# Altium footprint library ref-packages.PCBLIB: 1544 footprints (part 14 of 103)
Each footprint in its own frame and in the unit in brackets; x right, y up, seen from the top. Pads: shape width x height; smd on the part's side, far side on the other; paste and mask are expansions set on the pad; w line width, h text height; cw(c..) or ccw(c..) is an arc to the next point about the centre after c.
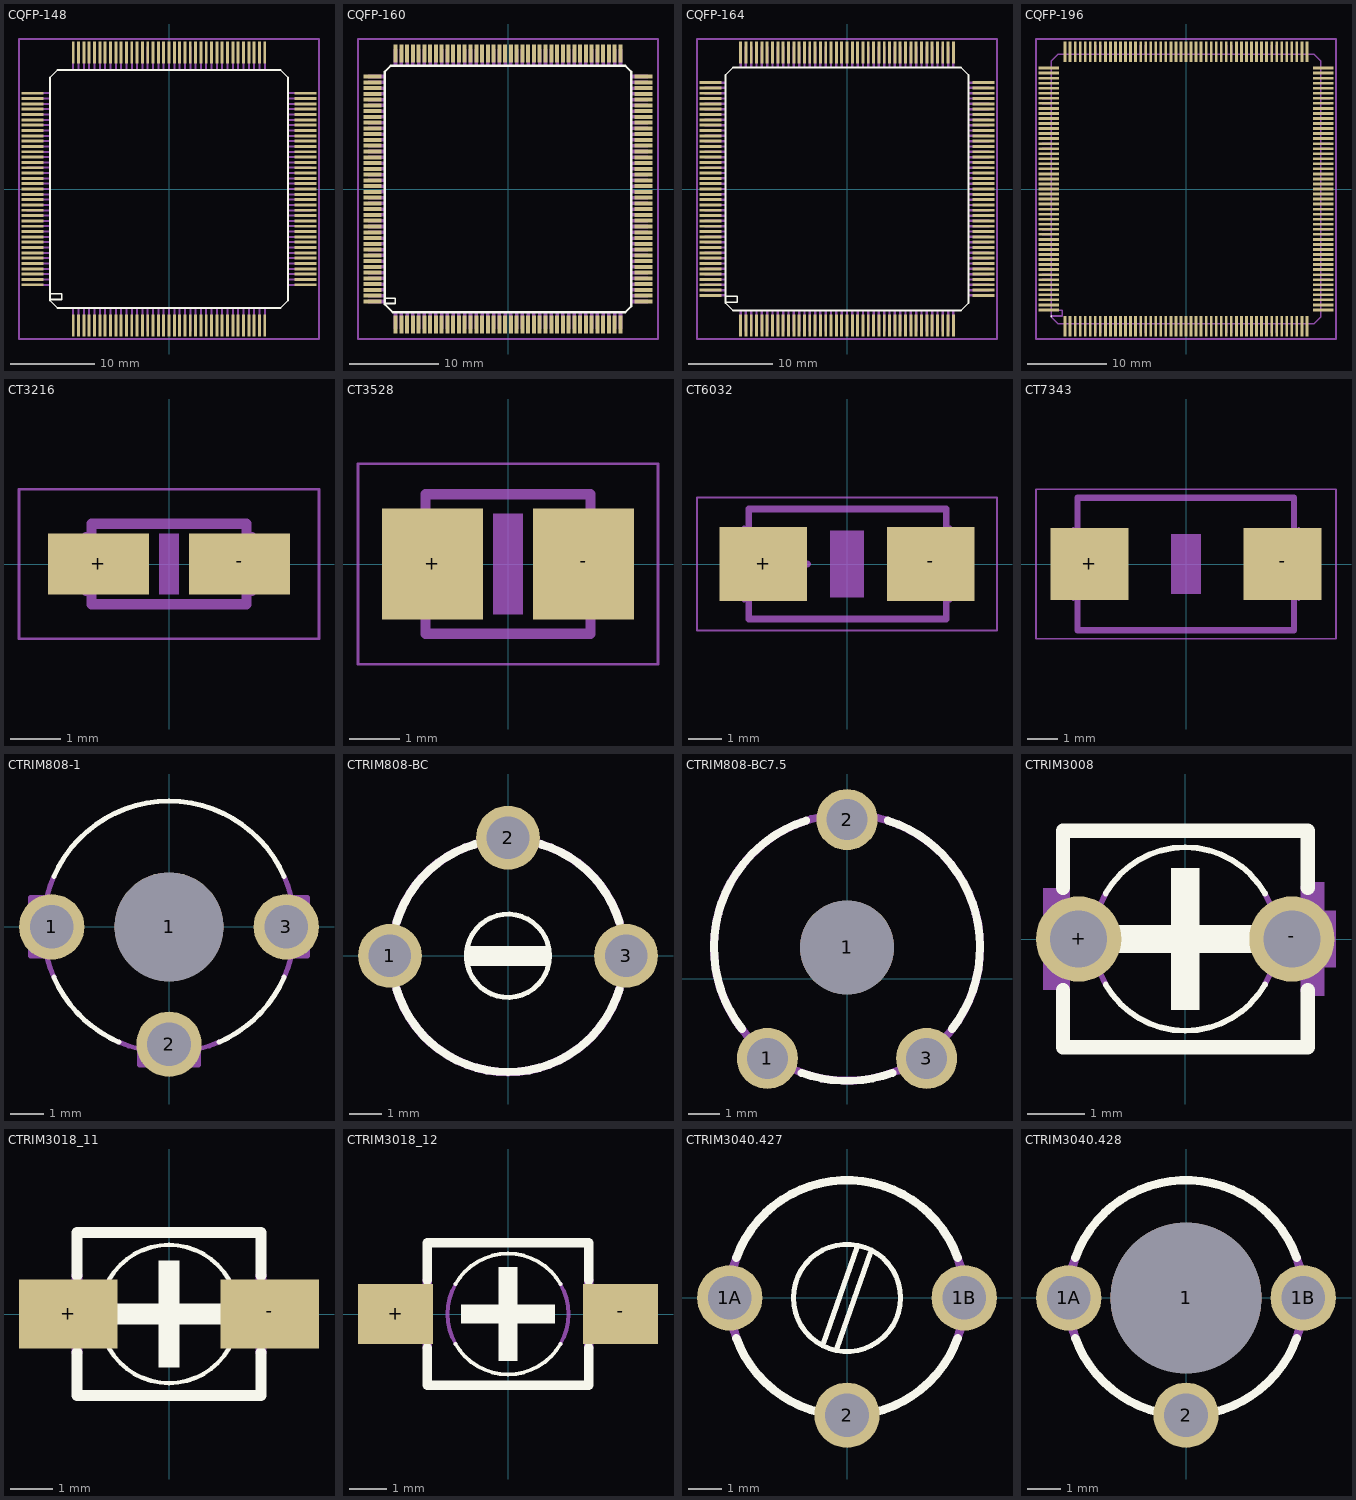
[diagram p13: the footprints below, top view; thin cyan lines are the x and y axes]

## CQFP-148 [mm]
pads (148):
  rect 0.35x2.6 smd: 1(-11.43,-16.3) 2(-10.795,-16.3) 3(-10.16,-16.3) 4(-9.525,-16.3) 5(-8.89,-16.3) 6(-8.255,-16.3) 7(-7.62,-16.3) 8(-6.985,-16.3) 9(-6.35,-16.3) 10(-5.715,-16.3) 11(-5.08,-16.3) 12(-4.445,-16.3) 13(-3.81,-16.3) 14(-3.175,-16.3) 15(-2.54,-16.3) 16(-1.905,-16.3) 17(-1.27,-16.3) 18(-0.635,-16.3) 19(0,-16.3) 20(0.635,-16.3) 21(1.27,-16.3) 22(1.905,-16.3) 23(2.54,-16.3) 24(3.175,-16.3) 25(3.81,-16.3) 26(4.445,-16.3) 27(5.08,-16.3) 28(5.715,-16.3) 29(6.35,-16.3) 30(6.985,-16.3) 31(7.62,-16.3) 32(8.255,-16.3) 33(8.89,-16.3) 34(9.525,-16.3) 35(10.16,-16.3) 36(10.795,-16.3) 37(11.43,-16.3) 75(11.43,16.3) 76(10.795,16.3) 77(10.16,16.3) 78(9.525,16.3) 79(8.89,16.3) 80(8.255,16.3) 81(7.62,16.3) 82(6.985,16.3) 83(6.35,16.3) 84(5.715,16.3) 85(5.08,16.3) 86(4.445,16.3) 87(3.81,16.3) 88(3.175,16.3) 89(2.54,16.3) 90(1.905,16.3) 91(1.27,16.3) 92(0.635,16.3) 93(0,16.3) 94(-0.635,16.3) 95(-1.27,16.3) 96(-1.905,16.3) 97(-2.54,16.3) 98(-3.175,16.3) 99(-3.81,16.3) 100(-4.445,16.3) 101(-5.08,16.3) 102(-5.715,16.3) 103(-6.35,16.3) 104(-6.985,16.3) 105(-7.62,16.3) 106(-8.255,16.3) 107(-8.89,16.3) 108(-9.525,16.3) 109(-10.16,16.3) 110(-10.795,16.3) 111(-11.43,16.3)
  rect 2.6x0.35 smd: 38(16.3,-11.43) 39(16.3,-10.795) 40(16.3,-10.16) 41(16.3,-9.525) 42(16.3,-8.89) 43(16.3,-8.255) 44(16.3,-7.62) 45(16.3,-6.985) 46(16.3,-6.35) 47(16.3,-5.715) 48(16.3,-5.08) 49(16.3,-4.445) 50(16.3,-3.81) 51(16.3,-3.175) 52(16.3,-2.54) 53(16.3,-1.905) 54(16.3,-1.27) 55(16.3,-0.635) 56(16.3,0) 57(16.3,0.635) 58(16.3,1.27) 59(16.3,1.905) 60(16.3,2.54) 61(16.3,3.175) 62(16.3,3.81) 63(16.3,4.445) 64(16.3,5.08) 65(16.3,5.715) 66(16.3,6.35) 67(16.3,6.985) 68(16.3,7.62) 69(16.3,8.255) 70(16.3,8.89) 71(16.3,9.525) 72(16.3,10.16) 73(16.3,10.795) 74(16.3,11.43) 112(-16.3,11.43) 113(-16.3,10.795) 114(-16.3,10.16) 115(-16.3,9.525) 116(-16.3,8.89) 117(-16.3,8.255) 118(-16.3,7.62) 119(-16.3,6.985) 120(-16.3,6.35) 121(-16.3,5.715) 122(-16.3,5.08) 123(-16.3,4.445) 124(-16.3,3.81) 125(-16.3,3.175) 126(-16.3,2.54) 127(-16.3,1.905) 128(-16.3,1.27) 129(-16.3,0.635) 130(-16.3,0) 131(-16.3,-0.635) 132(-16.3,-1.27) 133(-16.3,-1.905) 134(-16.3,-2.54) 135(-16.3,-3.175) 136(-16.3,-3.81) 137(-16.3,-4.445) 138(-16.3,-5.08) 139(-16.3,-5.715) 140(-16.3,-6.35) 141(-16.3,-6.985) 142(-16.3,-7.62) 143(-16.3,-8.255) 144(-16.3,-8.89) 145(-16.3,-9.525) 146(-16.3,-10.16) 147(-16.3,-10.795) 148(-16.3,-11.43)
Top Overlay:
  lines w0.203: -14.1,-12.5 -12.8,-12.5 -12.8,-13.2 -14.2,-13.2 ; -14.2,-13.2 -14.2,13.3 -13.3,14.2 13.3,14.2 14.2,13.3 14.2,-13.3 13.3,-14.2 -13.3,-14.2 -14.2,-13.3 -14.2,-13.2
Mechanical 16:
  rectangle: -11.55,-17 -11.31,-14.25
  rectangle: -10.915,-17 -10.675,-14.25
  rectangle: -10.28,-17 -10.04,-14.25
  rectangle: -9.645,-17 -9.405,-14.25
  rectangle: -9.01,-17 -8.77,-14.25
  rectangle: -8.375,-17 -8.135,-14.25
  rectangle: -7.74,-17 -7.5,-14.25
  rectangle: -7.105,-17 -6.865,-14.25
  rectangle: -6.47,-17 -6.23,-14.25
  rectangle: -5.835,-17 -5.595,-14.25
  rectangle: -5.2,-17 -4.96,-14.25
  rectangle: -4.565,-17 -4.325,-14.25
  rectangle: -3.93,-17 -3.69,-14.25
  rectangle: -3.295,-17 -3.055,-14.25
  rectangle: -2.66,-17 -2.42,-14.25
  rectangle: -2.025,-17 -1.785,-14.25
  rectangle: -1.39,-17 -1.15,-14.25
  rectangle: -0.755,-17 -0.515,-14.25
  rectangle: -0.12,-17 0.12,-14.25
  rectangle: 0.515,-17 0.755,-14.25
  rectangle: 1.15,-17 1.39,-14.25
  rectangle: 1.785,-17 2.025,-14.25
  rectangle: 2.42,-17 2.66,-14.25
  rectangle: 3.055,-17 3.295,-14.25
  rectangle: 3.69,-17 3.93,-14.25
  rectangle: 4.325,-17 4.565,-14.25
  rectangle: 4.96,-17 5.2,-14.25
  rectangle: 5.595,-17 5.835,-14.25
  rectangle: 6.23,-17 6.47,-14.25
  rectangle: 6.865,-17 7.105,-14.25
  rectangle: 7.5,-17 7.74,-14.25
  rectangle: 8.135,-17 8.375,-14.25
  rectangle: 8.77,-17 9.01,-14.25
  rectangle: 9.405,-17 9.645,-14.25
  rectangle: 10.04,-17 10.28,-14.25
  rectangle: 10.675,-17 10.915,-14.25
  rectangle: 11.31,-17 11.55,-14.25
  rectangle: 14.25,-11.55 17,-11.31
  rectangle: 14.25,-10.915 17,-10.675
  rectangle: 14.25,-10.28 17,-10.04
  rectangle: 14.25,-9.645 17,-9.405
  rectangle: 14.25,-9.01 17,-8.77
  rectangle: 14.25,-8.375 17,-8.135
  rectangle: 14.25,-7.74 17,-7.5
  rectangle: 14.25,-7.105 17,-6.865
  rectangle: 14.25,-6.47 17,-6.23
  rectangle: 14.25,-5.835 17,-5.595
  rectangle: 14.25,-5.2 17,-4.96
  rectangle: 14.25,-4.565 17,-4.325
  rectangle: 14.25,-3.93 17,-3.69
  rectangle: 14.25,-3.295 17,-3.055
  rectangle: 14.25,-2.66 17,-2.42
  rectangle: 14.25,-2.025 17,-1.785
  rectangle: 14.25,-1.39 17,-1.15
  rectangle: 14.25,-0.755 17,-0.515
  rectangle: 14.25,-0.12 17,0.12
  rectangle: 14.25,0.515 17,0.755
  rectangle: 14.25,1.15 17,1.39
  rectangle: 14.25,1.785 17,2.025
  rectangle: 14.25,2.42 17,2.66
  rectangle: 14.25,3.055 17,3.295
  rectangle: 14.25,3.69 17,3.93
  rectangle: 14.25,4.325 17,4.565
  rectangle: 14.25,4.96 17,5.2
  rectangle: 14.25,5.595 17,5.835
  rectangle: 14.25,6.23 17,6.47
  rectangle: 14.25,6.865 17,7.105
  rectangle: 14.25,7.5 17,7.74
  rectangle: 14.25,8.135 17,8.375
  rectangle: 14.25,8.77 17,9.01
  rectangle: 14.25,9.405 17,9.645
  rectangle: 14.25,10.04 17,10.28
  rectangle: 14.25,10.675 17,10.915
  rectangle: 14.25,11.31 17,11.55
  rectangle: 11.31,14.25 11.55,17
  rectangle: 10.675,14.25 10.915,17
  rectangle: 10.04,14.25 10.28,17
  rectangle: 9.405,14.25 9.645,17
  rectangle: 8.77,14.25 9.01,17
  rectangle: 8.135,14.25 8.375,17
  rectangle: 7.5,14.25 7.74,17
  rectangle: 6.865,14.25 7.105,17
  rectangle: 6.23,14.25 6.47,17
  rectangle: 5.595,14.25 5.835,17
  rectangle: 4.96,14.25 5.2,17
  rectangle: 4.325,14.25 4.565,17
  rectangle: 3.69,14.25 3.93,17
  rectangle: 3.055,14.25 3.295,17
  rectangle: 2.42,14.25 2.66,17
  rectangle: 1.785,14.25 2.025,17
  rectangle: 1.15,14.25 1.39,17
  rectangle: 0.515,14.25 0.755,17
  rectangle: -0.12,14.25 0.12,17
  rectangle: -0.755,14.25 -0.515,17
  rectangle: -1.39,14.25 -1.15,17
  rectangle: -2.025,14.25 -1.785,17
  rectangle: -2.66,14.25 -2.42,17
  rectangle: -3.295,14.25 -3.055,17
  rectangle: -3.93,14.25 -3.69,17
  rectangle: -4.565,14.25 -4.325,17
  rectangle: -5.2,14.25 -4.96,17
  rectangle: -5.835,14.25 -5.595,17
  rectangle: -6.47,14.25 -6.23,17
  rectangle: -7.105,14.25 -6.865,17
  rectangle: -7.74,14.25 -7.5,17
  rectangle: -8.375,14.25 -8.135,17
  rectangle: -9.01,14.25 -8.77,17
  rectangle: -9.645,14.25 -9.405,17
  rectangle: -10.28,14.25 -10.04,17
  rectangle: -10.915,14.25 -10.675,17
  rectangle: -11.55,14.25 -11.31,17
  rectangle: -17,11.31 -14.25,11.55
  rectangle: -17,10.675 -14.25,10.915
  rectangle: -17,10.04 -14.25,10.28
  rectangle: -17,9.405 -14.25,9.645
  rectangle: -17,8.77 -14.25,9.01
  rectangle: -17,8.135 -14.25,8.375
  rectangle: -17,7.5 -14.25,7.74
  rectangle: -17,6.865 -14.25,7.105
  rectangle: -17,6.23 -14.25,6.47
  rectangle: -17,5.595 -14.25,5.835
  rectangle: -17,4.96 -14.25,5.2
  rectangle: -17,4.325 -14.25,4.565
  rectangle: -17,3.69 -14.25,3.93
  rectangle: -17,3.055 -14.25,3.295
  rectangle: -17,2.42 -14.25,2.66
  rectangle: -17,1.785 -14.25,2.025
  rectangle: -17,1.15 -14.25,1.39
  rectangle: -17,0.515 -14.25,0.755
  rectangle: -17,-0.12 -14.25,0.12
  rectangle: -17,-0.755 -14.25,-0.515
  rectangle: -17,-1.39 -14.25,-1.15
  rectangle: -17,-2.025 -14.25,-1.785
  rectangle: -17,-2.66 -14.25,-2.42
  rectangle: -17,-3.295 -14.25,-3.055
  rectangle: -17,-3.93 -14.25,-3.69
  rectangle: -17,-4.565 -14.25,-4.325
  rectangle: -17,-5.2 -14.25,-4.96
  rectangle: -17,-5.835 -14.25,-5.595
  rectangle: -17,-6.47 -14.25,-6.23
  rectangle: -17,-7.105 -14.25,-6.865
  rectangle: -17,-7.74 -14.25,-7.5
  rectangle: -17,-8.375 -14.25,-8.135
  rectangle: -17,-9.01 -14.25,-8.77
  rectangle: -17,-9.645 -14.25,-9.405
  rectangle: -17,-10.28 -14.25,-10.04
  rectangle: -17,-10.915 -14.25,-10.675
  rectangle: -17,-11.55 -14.25,-11.31
Mechanical 27:
  lines w0.2: -17.903,-17.903 17.903,-17.903 17.903,17.903 -17.903,17.903 -17.903,-17.903

## CQFP-160 [mm]
pads (160):
  rect 0.45x2 smd: 1(-12.675,-15.275) 2(-12.025,-15.275) 3(-11.375,-15.275) 4(-10.725,-15.275) 5(-10.075,-15.275) 6(-9.425,-15.275) 7(-8.775,-15.275) 8(-8.125,-15.275) 9(-7.475,-15.275) 10(-6.825,-15.275) 11(-6.175,-15.275) 12(-5.525,-15.275) 13(-4.875,-15.275) 14(-4.225,-15.275) 15(-3.575,-15.275) 16(-2.925,-15.275) 17(-2.275,-15.275) 18(-1.625,-15.275) 19(-0.975,-15.275) 20(-0.325,-15.275) 21(0.325,-15.275) 22(0.975,-15.275) 23(1.625,-15.275) 24(2.275,-15.275) 25(2.925,-15.275) 26(3.575,-15.275) 27(4.225,-15.275) 28(4.875,-15.275) 29(5.525,-15.275) 30(6.175,-15.275) 31(6.825,-15.275) 32(7.475,-15.275) 33(8.125,-15.275) 34(8.775,-15.275) 35(9.425,-15.275) 36(10.075,-15.275) 37(10.725,-15.275) 38(11.375,-15.275) 39(12.025,-15.275) 40(12.675,-15.275) 81(12.675,15.275) 82(12.025,15.275) 83(11.375,15.275) 84(10.725,15.275) 85(10.075,15.275) 86(9.425,15.275) 87(8.775,15.275) 88(8.125,15.275) 89(7.475,15.275) 90(6.825,15.275) 91(6.175,15.275) 92(5.525,15.275) 93(4.875,15.275) 94(4.225,15.275) 95(3.575,15.275) 96(2.925,15.275) 97(2.275,15.275) 98(1.625,15.275) 99(0.975,15.275) 100(0.325,15.275) 101(-0.325,15.275) 102(-0.975,15.275) 103(-1.625,15.275) 104(-2.275,15.275) 105(-2.925,15.275) 106(-3.575,15.275) 107(-4.225,15.275) 108(-4.875,15.275) 109(-5.525,15.275) 110(-6.175,15.275) 111(-6.825,15.275) 112(-7.475,15.275) 113(-8.125,15.275) 114(-8.775,15.275) 115(-9.425,15.275) 116(-10.075,15.275) 117(-10.725,15.275) 118(-11.375,15.275) 119(-12.025,15.275) 120(-12.675,15.275)
  rect 2x0.45 smd: 41(15.275,-12.675) 42(15.275,-12.025) 43(15.275,-11.375) 44(15.275,-10.725) 45(15.275,-10.075) 46(15.275,-9.425) 47(15.275,-8.775) 48(15.275,-8.125) 49(15.275,-7.475) 50(15.275,-6.825) 51(15.275,-6.175) 52(15.275,-5.525) 53(15.275,-4.875) 54(15.275,-4.225) 55(15.275,-3.575) 56(15.275,-2.925) 57(15.275,-2.275) 58(15.275,-1.625) 59(15.275,-0.975) 60(15.275,-0.325) 61(15.275,0.325) 62(15.275,0.975) 63(15.275,1.625) 64(15.275,2.275) 65(15.275,2.925) 66(15.275,3.575) 67(15.275,4.225) 68(15.275,4.875) 69(15.275,5.525) 70(15.275,6.175) 71(15.275,6.825) 72(15.275,7.475) 73(15.275,8.125) 74(15.275,8.775) 75(15.275,9.425) 76(15.275,10.075) 77(15.275,10.725) 78(15.275,11.375) 79(15.275,12.025) 80(15.275,12.675) 121(-15.275,12.675) 122(-15.275,12.025) 123(-15.275,11.375) 124(-15.275,10.725) 125(-15.275,10.075) 126(-15.275,9.425) 127(-15.275,8.775) 128(-15.275,8.125) 129(-15.275,7.475) 130(-15.275,6.825) 131(-15.275,6.175) 132(-15.275,5.525) 133(-15.275,4.875) 134(-15.275,4.225) 135(-15.275,3.575) 136(-15.275,2.925) 137(-15.275,2.275) 138(-15.275,1.625) 139(-15.275,0.975) 140(-15.275,0.325) 141(-15.275,-0.325) 142(-15.275,-0.975) 143(-15.275,-1.625) 144(-15.275,-2.275) 145(-15.275,-2.925) 146(-15.275,-3.575) 147(-15.275,-4.225) 148(-15.275,-4.875) 149(-15.275,-5.525) 150(-15.275,-6.175) 151(-15.275,-6.825) 152(-15.275,-7.475) 153(-15.275,-8.125) 154(-15.275,-8.775) 155(-15.275,-9.425) 156(-15.275,-10.075) 157(-15.275,-10.725) 158(-15.275,-11.375) 159(-15.275,-12.025) 160(-15.275,-12.675)
Top Overlay:
  lines w0.203: -13.8,-12.9 -12.7,-12.9 -12.7,-12.3 -13.8,-12.3
  lines w0.254: -13.9,-13 -13,-13.9 13.2,-13.9 13.9,-13.2 13.9,13.2 13.2,13.9 -13.2,13.9 -13.9,13.2 -13.9,-13
Mechanical 16:
  drawing of 160 lines, arcs and shapes, not listed
Mechanical 27:
  lines w0.2: -16.903,-16.903 16.903,-16.903 16.903,16.903 -16.903,16.903 -16.903,-16.903

## CQFP-164 [mm]
pads (164):
  rect 0.35x2.6 smd: 1(-12.7,-16.3) 2(-12.065,-16.3) 3(-11.43,-16.3) 4(-10.795,-16.3) 5(-10.16,-16.3) 6(-9.525,-16.3) 7(-8.89,-16.3) 8(-8.255,-16.3) 9(-7.62,-16.3) 10(-6.985,-16.3) 11(-6.35,-16.3) 12(-5.715,-16.3) 13(-5.08,-16.3) 14(-4.445,-16.3) 15(-3.81,-16.3) 16(-3.175,-16.3) 17(-2.54,-16.3) 18(-1.905,-16.3) 19(-1.27,-16.3) 20(-0.635,-16.3) 21(0,-16.3) 22(0.635,-16.3) 23(1.27,-16.3) 24(1.905,-16.3) 25(2.54,-16.3) 26(3.175,-16.3) 27(3.81,-16.3) 28(4.445,-16.3) 29(5.08,-16.3) 30(5.715,-16.3) 31(6.35,-16.3) 32(6.985,-16.3) 33(7.62,-16.3) 34(8.255,-16.3) 35(8.89,-16.3) 36(9.525,-16.3) 37(10.16,-16.3) 38(10.795,-16.3) 39(11.43,-16.3) 40(12.065,-16.3) 41(12.7,-16.3) 83(12.7,16.3) 84(12.065,16.3) 85(11.43,16.3) 86(10.795,16.3) 87(10.16,16.3) 88(9.525,16.3) 89(8.89,16.3) 90(8.255,16.3) 91(7.62,16.3) 92(6.985,16.3) 93(6.35,16.3) 94(5.715,16.3) 95(5.08,16.3) 96(4.445,16.3) 97(3.81,16.3) 98(3.175,16.3) 99(2.54,16.3) 100(1.905,16.3) 101(1.27,16.3) 102(0.635,16.3) 103(0,16.3) 104(-0.635,16.3) 105(-1.27,16.3) 106(-1.905,16.3) 107(-2.54,16.3) 108(-3.175,16.3) 109(-3.81,16.3) 110(-4.445,16.3) 111(-5.08,16.3) 112(-5.715,16.3) 113(-6.35,16.3) 114(-6.985,16.3) 115(-7.62,16.3) 116(-8.255,16.3) 117(-8.89,16.3) 118(-9.525,16.3) 119(-10.16,16.3) 120(-10.795,16.3) 121(-11.43,16.3) 122(-12.065,16.3) 123(-12.7,16.3)
  rect 2.6x0.35 smd: 42(16.3,-12.7) 43(16.3,-12.065) 44(16.3,-11.43) 45(16.3,-10.795) 46(16.3,-10.16) 47(16.3,-9.525) 48(16.3,-8.89) 49(16.3,-8.255) 50(16.3,-7.62) 51(16.3,-6.985) 52(16.3,-6.35) 53(16.3,-5.715) 54(16.3,-5.08) 55(16.3,-4.445) 56(16.3,-3.81) 57(16.3,-3.175) 58(16.3,-2.54) 59(16.3,-1.905) 60(16.3,-1.27) 61(16.3,-0.635) 62(16.3,0) 63(16.3,0.635) 64(16.3,1.27) 65(16.3,1.905) 66(16.3,2.54) 67(16.3,3.175) 68(16.3,3.81) 69(16.3,4.445) 70(16.3,5.08) 71(16.3,5.715) 72(16.3,6.35) 73(16.3,6.985) 74(16.3,7.62) 75(16.3,8.255) 76(16.3,8.89) 77(16.3,9.525) 78(16.3,10.16) 79(16.3,10.795) 80(16.3,11.43) 81(16.3,12.065) 82(16.3,12.7) 124(-16.3,12.7) 125(-16.3,12.065) 126(-16.3,11.43) 127(-16.3,10.795) 128(-16.3,10.16) 129(-16.3,9.525) 130(-16.3,8.89) 131(-16.3,8.255) 132(-16.3,7.62) 133(-16.3,6.985) 134(-16.3,6.35) 135(-16.3,5.715) 136(-16.3,5.08) 137(-16.3,4.445) 138(-16.3,3.81) 139(-16.3,3.175) 140(-16.3,2.54) 141(-16.3,1.905) 142(-16.3,1.27) 143(-16.3,0.635) 144(-16.3,0) 145(-16.3,-0.635) 146(-16.3,-1.27) 147(-16.3,-1.905) 148(-16.3,-2.54) 149(-16.3,-3.175) 150(-16.3,-3.81) 151(-16.3,-4.445) 152(-16.3,-5.08) 153(-16.3,-5.715) 154(-16.3,-6.35) 155(-16.3,-6.985) 156(-16.3,-7.62) 157(-16.3,-8.255) 158(-16.3,-8.89) 159(-16.3,-9.525) 160(-16.3,-10.16) 161(-16.3,-10.795) 162(-16.3,-11.43) 163(-16.3,-12.065) 164(-16.3,-12.7)
Top Overlay:
  lines w0.203: -14.4,-12.8 -13.1,-12.8 -13.1,-13.5 -14.5,-13.5 ; -14.5,-13.5 -14.5,13.6 -13.6,14.5 13.6,14.5 14.5,13.6 14.5,-13.6 13.6,-14.5 -13.6,-14.5 -14.5,-13.6 -14.5,-13.5
Mechanical 16:
  drawing of 164 lines, arcs and shapes, not listed
Mechanical 27:
  lines w0.2: -17.903,-17.903 17.903,-17.903 17.903,17.903 -17.903,17.903 -17.903,-17.903

## CQFP-196 [mm]
pads (196):
  rect 0.35x2.6 smd: 1(-15.24,-17.3) 2(-14.605,-17.3) 3(-13.97,-17.3) 4(-13.335,-17.3) 5(-12.7,-17.3) 6(-12.065,-17.3) 7(-11.43,-17.3) 8(-10.795,-17.3) 9(-10.16,-17.3) 10(-9.525,-17.3) 11(-8.89,-17.3) 12(-8.255,-17.3) 13(-7.62,-17.3) 14(-6.985,-17.3) 15(-6.35,-17.3) 16(-5.715,-17.3) 17(-5.08,-17.3) 18(-4.445,-17.3) 19(-3.81,-17.3) 20(-3.175,-17.3) 21(-2.54,-17.3) 22(-1.905,-17.3) 23(-1.27,-17.3) 24(-0.635,-17.3) 25(0,-17.3) 26(0.635,-17.3) 27(1.27,-17.3) 28(1.905,-17.3) 29(2.54,-17.3) 30(3.175,-17.3) 31(3.81,-17.3) 32(4.445,-17.3) 33(5.08,-17.3) 34(5.715,-17.3) 35(6.35,-17.3) 36(6.985,-17.3) 37(7.62,-17.3) 38(8.255,-17.3) 39(8.89,-17.3) 40(9.525,-17.3) 41(10.16,-17.3) 42(10.795,-17.3) 43(11.43,-17.3) 44(12.065,-17.3) 45(12.7,-17.3) 46(13.335,-17.3) 47(13.97,-17.3) 48(14.605,-17.3) 49(15.24,-17.3) 99(15.24,17.3) 100(14.605,17.3) 101(13.97,17.3) 102(13.335,17.3) 103(12.7,17.3) 104(12.065,17.3) 105(11.43,17.3) 106(10.795,17.3) 107(10.16,17.3) 108(9.525,17.3) 109(8.89,17.3) 110(8.255,17.3) 111(7.62,17.3) 112(6.985,17.3) 113(6.35,17.3) 114(5.715,17.3) 115(5.08,17.3) 116(4.445,17.3) 117(3.81,17.3) 118(3.175,17.3) 119(2.54,17.3) 120(1.905,17.3) 121(1.27,17.3) 122(0.635,17.3) 123(0,17.3) 124(-0.635,17.3) 125(-1.27,17.3) 126(-1.905,17.3) 127(-2.54,17.3) 128(-3.175,17.3) 129(-3.81,17.3) 130(-4.445,17.3) 131(-5.08,17.3) 132(-5.715,17.3) 133(-6.35,17.3) 134(-6.985,17.3) 135(-7.62,17.3) 136(-8.255,17.3) 137(-8.89,17.3) 138(-9.525,17.3) 139(-10.16,17.3) 140(-10.795,17.3) 141(-11.43,17.3) 142(-12.065,17.3) 143(-12.7,17.3) 144(-13.335,17.3) 145(-13.97,17.3) 146(-14.605,17.3) 147(-15.24,17.3)
  rect 2.6x0.35 smd: 50(17.3,-15.24) 51(17.3,-14.605) 52(17.3,-13.97) 53(17.3,-13.335) 54(17.3,-12.7) 55(17.3,-12.065) 56(17.3,-11.43) 57(17.3,-10.795) 58(17.3,-10.16) 59(17.3,-9.525) 60(17.3,-8.89) 61(17.3,-8.255) 62(17.3,-7.62) 63(17.3,-6.985) 64(17.3,-6.35) 65(17.3,-5.715) 66(17.3,-5.08) 67(17.3,-4.445) 68(17.3,-3.81) 69(17.3,-3.175) 70(17.3,-2.54) 71(17.3,-1.905) 72(17.3,-1.27) 73(17.3,-0.635) 74(17.3,0) 75(17.3,0.635) 76(17.3,1.27) 77(17.3,1.905) 78(17.3,2.54) 79(17.3,3.175) 80(17.3,3.81) 81(17.3,4.445) 82(17.3,5.08) 83(17.3,5.715) 84(17.3,6.35) 85(17.3,6.985) 86(17.3,7.62) 87(17.3,8.255) 88(17.3,8.89) 89(17.3,9.525) 90(17.3,10.16) 91(17.3,10.795) 92(17.3,11.43) 93(17.3,12.065) 94(17.3,12.7) 95(17.3,13.335) 96(17.3,13.97) 97(17.3,14.605) 98(17.3,15.24) 148(-17.3,15.24) 149(-17.3,14.605) 150(-17.3,13.97) 151(-17.3,13.335) 152(-17.3,12.7) 153(-17.3,12.065) 154(-17.3,11.43) 155(-17.3,10.795) 156(-17.3,10.16) 157(-17.3,9.525) 158(-17.3,8.89) 159(-17.3,8.255) 160(-17.3,7.62) 161(-17.3,6.985) 162(-17.3,6.35) 163(-17.3,5.715) 164(-17.3,5.08) 165(-17.3,4.445) 166(-17.3,3.81) 167(-17.3,3.175) 168(-17.3,2.54) 169(-17.3,1.905) 170(-17.3,1.27) 171(-17.3,0.635) 172(-17.3,0) 173(-17.3,-0.635) 174(-17.3,-1.27) 175(-17.3,-1.905) 176(-17.3,-2.54) 177(-17.3,-3.175) 178(-17.3,-3.81) 179(-17.3,-4.445) 180(-17.3,-5.08) 181(-17.3,-5.715) 182(-17.3,-6.35) 183(-17.3,-6.985) 184(-17.3,-7.62) 185(-17.3,-8.255) 186(-17.3,-8.89) 187(-17.3,-9.525) 188(-17.3,-10.16) 189(-17.3,-10.795) 190(-17.3,-11.43) 191(-17.3,-12.065) 192(-17.3,-12.7) 193(-17.3,-13.335) 194(-17.3,-13.97) 195(-17.3,-14.605) 196(-17.3,-15.24)
Top Overlay:
  lines w0.203: -17,-16.1 -17,-16
Mechanical 16:
  drawing of 207 lines, arcs and shapes, not listed
Mechanical 27:
  lines w0.2: -18.903,-18.903 18.903,-18.903 18.903,18.903 -18.903,18.903 -18.903,-18.903

## CT3216 [mm]
pads (2):
  rect 2x1.2 smd: +(-1.4,0) -(1.4,0)
Mechanical 6:
  rectangle: -0.2,-0.6 0.2,0.6
Mechanical 16:
  lines w0.152: -1.651,-0.559 -1.651,0.559 ; 1.651,-0.559 1.651,0.559
  lines w0.203: -1.26,0 -0.7,0 ; -0.97,-0.3 -0.97,0.26 ; -1.535,-0.798 -1.535,0.798 1.535,0.798 1.535,-0.798 -1.535,-0.798
Mechanical 27:
  lines w0.051: -2.973,-1.483 2.973,-1.483 2.973,1.483 -2.973,1.483 -2.973,-1.483

## CT3528 [mm]
pads (2):
  rect 2x2.2 smd: +(-1.5,0) -(1.5,0)
Mechanical 6:
  rectangle: -0.3,-1 0.3,1
Mechanical 16:
  lines w0.152: -1.778,-1.016 -1.778,1.016 ; 1.778,-1.016 1.778,1.016
  lines w0.203: -1.31,0 -0.68,0 ; -1,-0.33 -1,0.3 ; -1.637,-1.383 -1.637,1.383 1.637,1.383 1.637,-1.383 -1.637,-1.383
Mechanical 27:
  lines w0.051: -2.973,-1.983 2.973,-1.983 2.973,1.983 -2.973,1.983 -2.973,-1.983

## CT6032 [mil]
pads (2):
  rect 102.36x86.61 smd: +(-98.43,0) -(98.43,0)
Mechanical 6:
  rectangle: -19.69,-39.37 19.69,39.37
Mechanical 16:
  lines w6: -120.98,-42.01 -120.98,42.01 ; 120.98,-42.01 120.98,42.01
  lines w8: -96.46,0 -46.46,0 ; -70.87,-25.2 -70.87,24.8 ; -115.43,-64.45 -115.43,64.45 116.42,64.45 116.42,-64.45 -115.43,-64.45
Mechanical 27:
  lines w2: -176.1,-78.07 176.1,-78.07 176.1,78.07 -176.1,78.07 -176.1,-78.07

## CT7343 [mil]
pads (2):
  rect 102.36x94.49 smd: +(-125.98,0) -(125.98,0)
Mechanical 6:
  rectangle: -19.69,-39.37 19.69,39.37
Mechanical 16:
  lines w6: -147.01,-45 -147.01,45 ; 147.01,-45 147.01,45
  lines w8: -121.65,0 -80.32,0 ; -100.39,-20.47 -100.39,20.47 ; -141.42,-86.42 -141.42,86.42 141.02,86.42 141.02,-86.42 -141.42,-86.42
Mechanical 27:
  lines w2: -195.79,-97.76 195.79,-97.76 195.79,97.76 -195.79,97.76 -195.79,-97.76

## CTRIM808-1 [mil]
pads (4):
  round 78 hole 52: 1(-140,0) 2(0,-140) 3(140,0)
  round 130 hole 130: 1(0,0)
Top Overlay:
  circle w6: c0,0 r50
  rectangle: -50,-10 50,10
  lines w6: -137.5,-59.95 ccw(c0,0) -59.95,-137.5 ; -137.5,59.95 cw(c0,0) 137.5,59.95 ; -48.99,-10 48.99,-10 ; -48.99,10 48.99,10 ; 59.95,-137.5 ccw(c0,0) 137.5,-59.95
Mechanical 16:
  lines w6: -145.87,-35 -165,-35 -165,35 -145.87,35 ; -137.5,-59.95 cw(c0,0) -137.5,59.95 ; -59.95,-137.5 ccw(c0,0) 59.95,-137.5 ; -35,-145.87 -35,-165 35,-165 35,-145.87 ; 137.5,-59.95 ccw(c0,0) 137.5,59.95 ; 145.87,-35 165,-35 165,35 145.87,35

## CTRIM808-BC [mil]
pads (3):
  round 76.77 hole 51.18: 1(-142,0) 2(0,142) 3(142,0)
Top Overlay:
  circle w6: c0,0 r50.04
  rectangle: -48,-12 48,12
  lines w10: -134,-40 ccw(c0,0) 134,-40 ; -134,40 cw(c0,0) -40,134 ; 40,134 cw(c0,0) 134,40
Mechanical 16:
  circle w10: c0,0 r140

## CTRIM808-BC7.5 [mm]
pads (4):
  round 1.95 hole 1.3: 1(-2.54,-2.54) 2(0,5.08) 3(2.54,-2.54)
  round 3 hole 3: 1(0,1)
Top Overlay:
  circle w0.152: c0,1 r1.271
  rectangle: -1.219,0.695 1.219,1.305
  lines w0.254: -3.35,-1.6 cw(c0,1.008) -1.3,5.05 ; -1.45,-3 ccw(c0,1) 1.45,-3 ; 1.3,5.05 cw(c0,1.008) 3.35,-1.6
Mechanical 16:
  circle w0.254: c0,1 r4.25

## CTRIM3008 [mm]
pads (2):
  round 1.5 hole 1: +(-1.875,0) -(1.875,0)
Top Overlay:
  rectangle: -0.25,-1.25 0.25,1.25
  rectangle: -1.25,-0.25 1.25,0.25
  lines w0.102: -1.4,-0.8 ccw(c0,0) 1.4,-0.8 ; -1.4,0.8 cw(c0,0) 1.4,0.8
  lines w0.254: -2.15,-0.9 -2.15,-1.9 2.15,-1.9 2.15,-0.9 ; -2.15,0.9 -2.15,1.9 2.15,1.9 2.15,0.9
Mechanical 16:
  rectangle: -2.5,-0.9 -2.25,0.9
  rectangle: 2.25,-1 2.45,1
  rectangle: 2.45,-0.5 2.65,0.5
  lines w0.102: -1.4,-0.8 cw(c0,0) -1.4,0.8 ; 1.4,-0.8 ccw(c0,0) 1.4,0.8
  lines w0.254: -2.15,-0.9 -2.15,0.9 ; 2.15,-0.9 2.15,0.9

## CTRIM3018_11 [mm]
pads (2):
  rect 2.3x1.6 smd: +(-2.35,0) -(2.35,0)
Top Overlay:
  rectangle: -0.25,-1.25 0.25,1.25
  rectangle: -1.25,-0.25 1.25,0.25
  lines w0.102: -1.4,-0.8 ccw(c0,0) 1.4,-0.8 ; -1.4,0.8 cw(c0,0) 1.4,0.8
  lines w0.254: -2.15,-0.9 -2.15,-1.9 2.15,-1.9 2.15,-0.9 ; -2.15,0.9 -2.15,1.9 2.15,1.9 2.15,0.9
Mechanical 16:
  rectangle: -2.6,-0.6 -2.25,0.6
  rectangle: 2.25,-0.6 2.6,0.6
  lines w0.102: -1.4,-0.8 cw(c0,0) -1.4,0.8 ; 1.4,-0.8 ccw(c0,0) 1.4,0.8
  lines w0.254: -2.15,-0.9 -2.15,0.9 ; 2.15,-0.9 2.15,0.9

## CTRIM3018_12 [mm]
pads (2):
  rect 2x1.6 smd: +(-3,0) -(3,0)
Top Overlay:
  rectangle: -0.25,-1.25 0.25,1.25
  rectangle: -1.25,-0.25 1.25,0.25
  lines w0.102: -1.4,-0.8 ccw(c0,0) 1.4,-0.8 ; -1.4,0.8 cw(c0,0) 1.4,0.8
  lines w0.254: -2.15,-0.9 -2.15,-1.9 2.15,-1.9 2.15,-0.9 ; -2.15,0.9 -2.15,1.9 2.15,1.9 2.15,0.9
Mechanical 16:
  rectangle: -3.5,-0.6 -2.25,0.6
  rectangle: 2.25,-0.6 3.5,0.6
  lines w0.102: -1.4,-0.8 cw(c0,0) -1.4,0.8 ; 1.4,-0.8 ccw(c0,0) 1.4,0.8
  lines w0.254: -2.15,-0.9 -2.15,0.9 ; 2.15,-0.9 2.15,0.9

## CTRIM3040.427 [mil]
pads (3):
  round 76.77 hole 51.18: 1A(-137.8,0) 1B(137.8,0) 2(0,-137.8)
Top Overlay:
  circle w6: c0,0 r62.99
  lines w6: -27.56,-53.15 11.81,59.06 ; -11.81,-59.06 27.56,53.15
  lines w10: -129.92,-47.24 ccw(c0,0) 129.92,-47.24 ; -129.92,47.24 cw(c0,0) 129.92,47.24
Mechanical 16:
  rectangle: -153.54,-23.62 -137.8,23.62
  rectangle: 137.8,-23.62 153.54,23.62
  rectangle: -23.62,-153.54 23.62,-137.8
  lines w10: -129.92,-47.24 cw(c-0.01,0) -129.92,47.24 ; 129.92,-47.24 ccw(c0.01,0) 129.92,47.24

## CTRIM3040.428 [mil]
pads (4):
  round 177.17 hole 177.17: 1(0,0)
  round 76.77 hole 51.18: 1A(-137.8,0) 1B(137.8,0) 2(0,-137.8)
Top Overlay:
  circle w6: c0,0 r62.99
  lines w6: -27.56,-51.18 11.81,59.06 ; -11.81,-59.06 27.56,51.18
  lines w10: -129.92,-47.24 ccw(c0,0) 129.92,-47.24 ; -129.92,47.24 cw(c0,0) 129.92,47.24
Mechanical 16:
  rectangle: -153.54,-23.62 -137.8,23.62
  rectangle: 137.8,-23.62 153.54,23.62
  rectangle: -23.62,-153.54 23.62,-137.8
  lines w10: -129.92,-47.24 cw(c-0.01,0) -129.92,47.24 ; 129.92,-47.24 ccw(c0.01,0) 129.92,47.24